# Altium footprint library 7-Connectors-13.PcbLib: 44 footprints (part 4 of 5)
Each footprint in its own frame and in the unit in brackets; x right, y up, seen from the top. Pads: shape width x height; smd on the part's side, far side on the other; paste and mask are expansions set on the pad; w line width, h text height; cw(c..) or ccw(c..) is an arc to the next point about the centre after c.
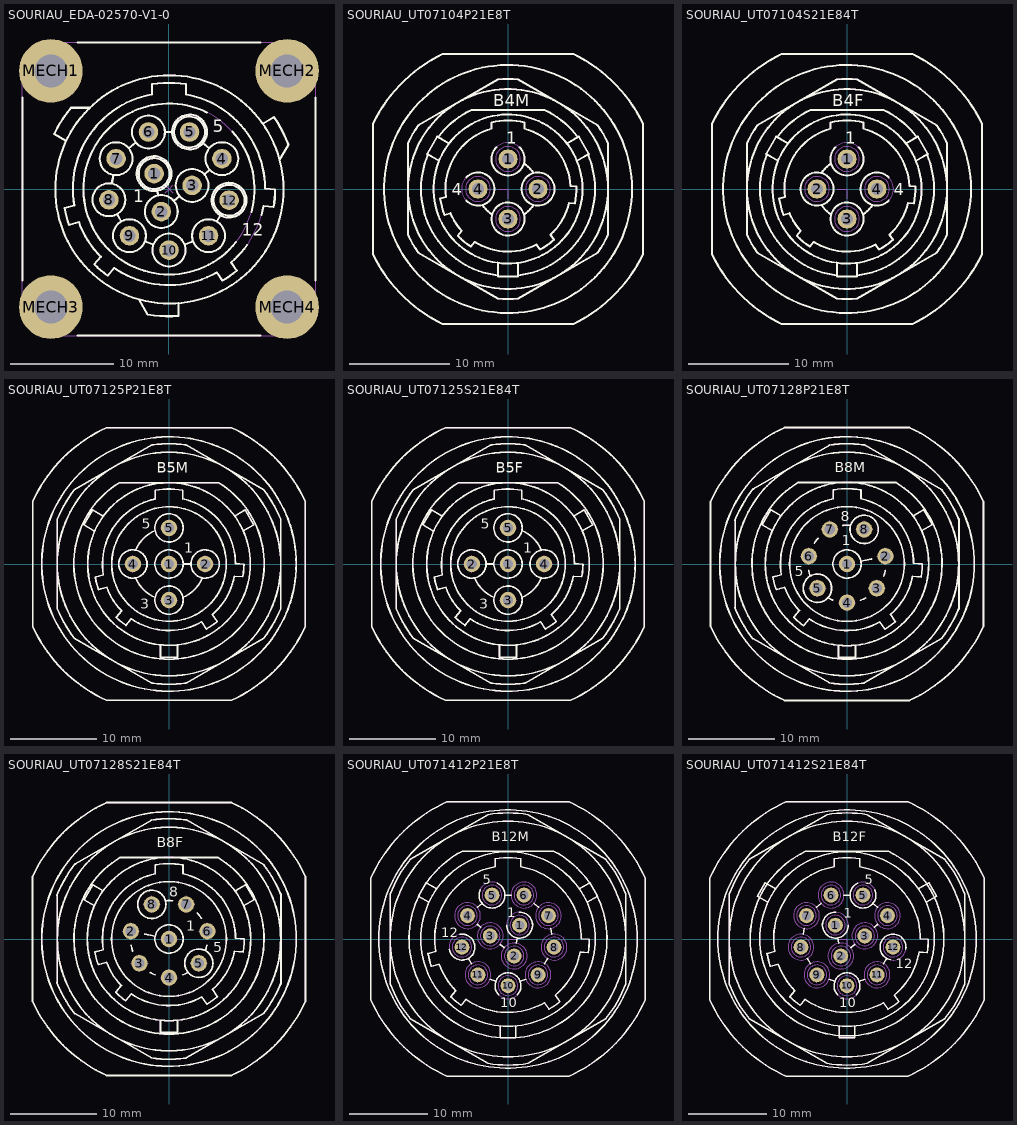
[diagram p3: the footprints below, top view; thin cyan lines are the x and y axes]

## SOURIAU_EDA-02570-V1-0 [mm] "Adapter Kit For PCB Mount For SOURIAU UTO01412S21T, 12 Poles, Shell Size 14, UT Bantam Circular Female Connecteur"
height 32.93
pads (16):
  round 1.9 hole 1.2: 1(-1.45,1.5) 2(-0.75,-2.2) 3(2.25,0.35) 4(5.15,2.95) 5(2,5.55) 6(-2,5.55) 7(-5.15,2.95) 8(-5.85,-1.05) 9(-3.85,-4.55) 10(0,-5.95) 11(3.85,-4.55) 12(5.85,-1.09)
  round 6.2 hole 3.2: MECH1(-11.505,11.505) MECH2(11.505,11.505) MECH3(-11.505,-11.505) MECH4(11.505,-11.505)
Top Overlay:
  circle w0.2: c0.043,-0.043 r11.113
  circle w0.2: c5.85,-1.09 r1.5
  circle w0.2: c2,5.55 r1.5
  circle w0.2: c-1.45,1.5 r1.5
  circle w0.2: c-5.85,-1.05 r1.6
  circle w0.2: c-3.85,-4.55 r1.6
  circle w0.2: c-0.75,-2.2 r1.6
  circle w0.2: c0,-5.95 r1.6
  circle w0.2: c3.85,-4.55 r1.6
  circle w0.2: c5.85,-1.09 r1.7
  circle w0.2: c2.25,0.35 r1.6
  circle w0.2: c-1.45,1.5 r1.7
  circle w0.2: c-5.15,2.95 r1.6
  circle w0.2: c5.15,2.95 r1.6
  circle w0.2: c2,5.55 r1.7
  circle w0.2: c-2,5.55 r1.6
  lines w0.2: -14.285,-8.914 -14.285,8.914 ; -10.012,4.689 -11.176,5.361 cw(c0,0) -9.541,7.913 -7.717,7.913 ; -8.914,-14.285 8.914,-14.285 ; -8.914,14.285 8.914,14.285 ; -5.574,0.526 -5.426,1.374 ; -5.056,-2.439 -4.644,-3.161 ; -3.916,3.969 -3.234,4.531 ; -2.93,-10.75 -2.082,-12.219 ccw(c0,0) 0.945,-12.359 0.945,-11.119 ; -2.346,-5.097 -1.504,-5.403 ; -1.153,-0.072 -1.047,-0.628 ; -0.4,5.55 0.4,5.55 ; 0.469,-1.164 1.031,-0.686 ; 1.504,-5.403 2.346,-5.097 ; 3.234,4.531 3.916,3.969 ; 3.441,1.418 3.959,1.882 ; 3.681,7.467 ccw(c0,0) 6.533,-5.16 ; 4.651,-3.165 5.049,-2.475 ; 6.161,5.599 cw(c0,0) 8.013,-2.258 ; 7.608,-5.452 cw(c0,0) 6.043,-7.148 6.604,-7.95 cw(c0,0) 5.212,-8.925 4.65,-8.123 cw(c0,0) -5.34,-7.687 -5.97,-8.437 cw(c0,0) -7.272,-7.344 -6.643,-6.594 cw(c0,0) -8.784,-3.234 -9.729,-3.487 cw(c0,0) -10.169,-1.845 -9.224,-1.592 cw(c0,0) -1.65,9.213 -1.65,10.202 cw(c0,0) 1.65,10.202 1.65,9.213 cw(c0,0) 9.36,0.034 10.335,-0.051 cw(c0,0) 10.187,-1.744 9.212,-1.659 cw(c0,0) 9.006,-2.551 ; 9.126,6.36 10.231,6.998 cw(c0,0) 11.623,4.306 10.775,2.838 ; 14.285,-8.914 14.285,8.914
  text "1" at -3.475,-1.3 h1.2
  text "5" at 4.275,5.525 h1.2
  text "12" at 7.075,-4.55 h1.2
Mechanical 8:
  lines w0.1: -12.005,-11.505 -11.505,-11.505 ; -12.005,11.505 -11.505,11.505 ; -11.505,-12.005 -11.505,-11.505 ; -11.505,-11.005 -11.505,-11.505 ; -11.505,11.005 -11.505,11.505 ; -11.505,12.005 -11.505,11.505 ; -11.005,-11.505 -11.505,-11.505 ; -11.005,11.505 -11.505,11.505 ; -6.35,-1.05 -5.85,-1.05 ; -5.85,-1.55 -5.85,-1.05 ; -5.85,-0.55 -5.85,-1.05 ; -5.65,2.95 -5.15,2.95 ; -5.35,-1.05 -5.85,-1.05 ; -5.15,2.45 -5.15,2.95 ; -5.15,3.45 -5.15,2.95 ; -4.65,2.95 -5.15,2.95 ; -4.35,-4.55 -3.85,-4.55 ; -3.85,-5.05 -3.85,-4.55 ; -3.85,-4.05 -3.85,-4.55 ; -3.35,-4.55 -3.85,-4.55 ; -2.5,5.55 -2,5.55 ; -2,5.05 -2,5.55 ; -2,6.05 -2,5.55 ; -1.95,1.5 -1.45,1.5 ; -1.5,5.55 -2,5.55 ; -1.45,1 -1.45,1.5 ; -1.45,2 -1.45,1.5 ; -1.25,-2.2 -0.75,-2.2 ; -0.95,1.5 -1.45,1.5 ; -0.75,-2.7 -0.75,-2.2 ; -0.75,-1.7 -0.75,-2.2 ; -0.5,-5.95 0,-5.95 ; -0.354,-0.354 0,0 ; -0.354,0.354 0,0 ; -0.25,-2.2 -0.75,-2.2 ; 0,-6.45 0,-5.95 ; 0,-5.45 0,-5.95 ; 0.354,-0.354 0,0 ; 0.354,0.354 0,0 ; 0.5,-5.95 0,-5.95 ; 1.5,5.55 2,5.55 ; 1.75,0.35 2.25,0.35 ; 2,5.05 2,5.55 ; 2,6.05 2,5.55 ; 2.25,-0.15 2.25,0.35 ; 2.25,0.85 2.25,0.35 ; 2.5,5.55 2,5.55 ; 2.75,0.35 2.25,0.35 ; 3.35,-4.55 3.85,-4.55 ; 3.85,-5.05 3.85,-4.55 ; 3.85,-4.05 3.85,-4.55 ; 4.35,-4.55 3.85,-4.55 ; 4.65,2.95 5.15,2.95 ; 5.15,2.45 5.15,2.95 ; 5.15,3.45 5.15,2.95 ; 5.35,-1.09 5.85,-1.09 ; 5.65,2.95 5.15,2.95 ; 5.85,-1.59 5.85,-1.09 ; 5.85,-0.59 5.85,-1.09 ; 6.35,-1.09 5.85,-1.09 ; 11.005,-11.505 11.505,-11.505 ; 11.005,11.505 11.505,11.505 ; 11.505,-12.005 11.505,-11.505 ; 11.505,-11.005 11.505,-11.505 ; 11.505,11.005 11.505,11.505 ; 11.505,12.005 11.505,11.505 ; 12.005,-11.505 11.505,-11.505 ; 12.005,11.505 11.505,11.505
Mechanical 14:
  circle w0.1: c11.505,-11.505 r1.45
  circle w0.1: c11.505,-11.505 r2.8
  circle w0.1: c-11.505,-11.505 r1.45
  circle w0.1: c-11.505,-11.505 r2.8
  circle w0.1: c-11.505,11.505 r1.45
  circle w0.1: c-11.505,11.505 r2.8
  circle w0.1: c11.505,11.505 r1.45
  circle w0.1: c11.505,11.505 r2.8
  circle w0.1: c-5.85,-1.05 r1.6
  circle w0.1: c-3.85,-4.55 r1.6
  circle w0.1: c-0.75,-2.2 r1.6
  circle w0.1: c0,-5.95 r1.6
  circle w0.1: c3.85,-4.55 r1.6
  circle w0.1: c5.85,-1.09 r1.6
  circle w0.1: c2.25,0.35 r1.6
  circle w0.1: c-1.45,1.5 r1.6
  circle w0.1: c-5.15,2.95 r1.6
  circle w0.1: c5.15,2.95 r1.6
  circle w0.1: c2,5.55 r1.6
  circle w0.1: c-2,5.55 r1.6
  circle w0.1: c0,0 r8.325
  circle w0.1: c0.043,-0.043 r11.113
  lines w0.1: -10.012,4.689 -11.176,5.361 cw(c0,0) -9.541,7.913 -7.717,7.913 ; -5.574,0.526 -5.426,1.374 ; -5.056,-2.439 -4.644,-3.161 ; -3.916,3.969 -3.234,4.531 ; -2.93,-10.75 -2.082,-12.219 ccw(c0,0) 0.945,-12.359 0.945,-11.119 ; -2.346,-5.097 -1.504,-5.403 ; -1.153,-0.072 -1.047,-0.628 ; -0.4,5.55 0.4,5.55 ; 0.469,-1.164 1.031,-0.686 ; 1.504,-5.403 2.346,-5.097 ; 3.234,4.531 3.916,3.969 ; 3.441,1.418 3.959,1.882 ; 4.651,-3.165 5.049,-2.475 ; 9.126,6.36 10.231,6.998 cw(c0,0) 11.623,4.306 10.775,2.838 ; -14.285,-12.603 -14.285,12.603 -12.603,14.285 12.603,14.285 14.285,12.603 14.285,-12.603 12.603,-14.285 -12.603,-14.285 -14.285,-12.603 ; -12.667,-11.861 ccw(c-12.475,-12.065) -12.395,-12.333 cw(c-12.254,-12.803) -11.777,-12.69 ccw(c-11.505,-12.625) -11.233,-12.69 cw(c-10.756,-12.803) -10.615,-12.333 ccw(c-10.535,-12.065) -10.343,-11.861 cw(c-10.007,-11.505) -10.343,-11.149 ccw(c-10.535,-10.945) -10.615,-10.677 cw(c-10.756,-10.207) -11.233,-10.32 ccw(c-11.505,-10.385) -11.777,-10.32 cw(c-12.254,-10.207) -12.395,-10.677 ccw(c-12.475,-10.945) -12.667,-11.149 cw(c-13.003,-11.505) -12.667,-11.861 ; -12.667,11.149 ccw(c-12.475,10.945) -12.395,10.677 cw(c-12.254,10.207) -11.777,10.32 ccw(c-11.505,10.385) -11.233,10.32 cw(c-10.756,10.207) -10.615,10.677 ccw(c-10.535,10.945) -10.343,11.149 cw(c-10.007,11.505) -10.343,11.861 ccw(c-10.535,12.065) -10.615,12.333 cw(c-10.756,12.803) -11.233,12.69 ccw(c-11.505,12.625) -11.777,12.69 cw(c-12.254,12.803) -12.395,12.333 ccw(c-12.475,12.065) -12.667,11.861 cw(c-13.003,11.505) -12.667,11.149 ; -10.169,-1.845 ccw(c0,0) -9.729,-3.487 -8.784,-3.234 ccw(c0,0) -6.643,-6.594 -7.272,-7.344 ccw(c0,0) -5.97,-8.437 -5.34,-7.687 ccw(c0,0) 4.65,-8.123 5.212,-8.925 ccw(c0,0) 6.604,-7.95 6.043,-7.148 ccw(c0,0) 9.212,-1.659 10.187,-1.744 ccw(c0,0) 10.335,-0.051 9.36,0.034 ccw(c0,0) 1.65,9.213 1.65,10.202 ccw(c0,0) -1.65,10.202 -1.65,9.213 ccw(c0,0) -9.224,-1.592 -10.169,-1.845 ; 10.343,-11.861 ccw(c10.535,-12.065) 10.615,-12.333 cw(c10.756,-12.803) 11.233,-12.69 ccw(c11.505,-12.625) 11.777,-12.69 cw(c12.254,-12.803) 12.395,-12.333 ccw(c12.475,-12.065) 12.667,-11.861 cw(c13.003,-11.505) 12.667,-11.149 ccw(c12.475,-10.945) 12.395,-10.677 cw(c12.254,-10.207) 11.777,-10.32 ccw(c11.505,-10.385) 11.233,-10.32 cw(c10.756,-10.207) 10.615,-10.677 ccw(c10.535,-10.945) 10.343,-11.149 cw(c10.007,-11.505) 10.343,-11.861 ; 10.343,11.149 ccw(c10.535,10.945) 10.615,10.677 cw(c10.756,10.207) 11.233,10.32 ccw(c11.505,10.385) 11.777,10.32 cw(c12.254,10.207) 12.395,10.677 ccw(c12.475,10.945) 12.667,11.149 cw(c13.003,11.505) 12.667,11.861 ccw(c12.475,12.065) 12.395,12.333 cw(c12.254,12.803) 11.777,12.69 ccw(c11.505,12.625) 11.233,12.69 cw(c10.756,12.803) 10.615,12.333 ccw(c10.535,12.065) 10.343,11.861 cw(c10.007,11.505) 10.343,11.149
  text "1" at -1.593,0.9 h1.2
  text "5" at 1.6,4.95 h1.2
  text "12" at 4.993,-1.69 h1.2
3D body "EDA-02570-V1-0.stp": height 32.93, standoff -5.89, extent -14.605,-14.604 14.605,14.599

## SOURIAU_UT07104P21E8T [mm] "Metal Circular Connector, 4 Male Contacts, Shell Size 10, UT07 Series"
height 31.7
pads (4):
  round 1.9 hole 1.2: 1(0,3) 2(3,0) 3(0,-3) 4(-3,0)
Top Overlay:
  circle w0.2: c3,0 r1.65
  circle w0.2: c0,-3 r1.65
  circle w0.2: c0,0 r12.4
  circle w0.2: c0,0 r10
  circle w0.2: c0,0 r7.45
  lines w0.2: -7.984,3.455 ccw(c0,0) -1,-8.642 ; -6.984,5.187 cw(c0,0) -3.644,7.9 3.644,7.9 cw(c0,0) 6.984,5.187 ; -6.894,2.825 -8.078,3.509 -7.078,5.241 -5.894,4.557 ; -4.175,-1.159 ccw(c-3,0) -4.175,1.159 ; -2.546,-1.586 ccw(c0,0) -1.586,-2.546 ; -1.159,4.175 ccw(c0,3) 1.159,4.175 ; -1,-7.383 -1,-8.75 1,-8.75 1,-7.383 ; 1,-8.642 ccw(c0,0) 7.984,3.455 ; 1.586,-2.546 ccw(c0,0) 2.546,-1.586 ; 1.586,2.546 cw(c0,0) 2.546,1.586 ; 5.894,4.557 7.078,5.241 8.078,3.509 6.894,2.825 ; -13.5,-6.538 ccw(c0,0) -6.538,-13.5 6.538,-13.5 ccw(c0,0) 13.5,-6.538 13.5,6.538 ccw(c0,0) 6.538,13.5 -6.538,13.5 ccw(c0,0) -13.5,6.538 -13.5,-6.538 ; -10,-4.583 ccw(c0,0) -8.969,-6.369 -1.031,-10.952 ccw(c0,0) 1.031,-10.952 8.969,-6.369 ccw(c0,0) 10,-4.583 10,4.583 ccw(c0,0) 8.969,6.369 1.031,10.952 ccw(c0,0) -1.031,10.952 -8.969,6.369 ccw(c0,0) -10,4.583 -10,-4.583 ; -6.785,-0.938 ccw(c0,0) -6.345,-2.58 -5.761,-2.424 ccw(c0,0) -4.631,-4.197 -5.02,-4.66 ccw(c0,0) -3.718,-5.753 -3.329,-5.29 ccw(c0,0) 2.855,-5.56 3.202,-6.055 ccw(c0,0) 4.595,-5.08 4.248,-4.585 ccw(c0,0) 6.094,-1.386 6.697,-1.439 ccw(c0,0) 6.845,0.254 6.242,0.307 ccw(c0,0) 1.65,6.028 1.65,6.648 ccw(c0,0) -1.65,6.648 -1.65,6.028 ccw(c0,0) -6.201,-0.782 -6.785,-0.938
  text "B4M" at -1.456,8.253 h1.2
  text "1" at -0.186,4.522 h1.2
  text "4" at -5.636,-0.625 h1.2
Mechanical 8:
  circle w0.1: c-3,0 r1.65
  circle w0.1: c-3,0 r1.25
  circle w0.1: c0,-3 r1.65
  circle w0.1: c0,-3 r1.25
  circle w0.1: c3,0 r1.65
  circle w0.1: c3,0 r1.25
  circle w0.1: c0,3 r1.65
  circle w0.1: c0,3 r1.25
  lines w0.1: -3,-1 -3,0 -2,0 ; -1,0 0,0 0,-1 ; 0,-4 0,-3 1,-3 ; 0,2 0,3 1,3 ; 3,-1 3,0 4,0
Mechanical 14:
  circle w0.1: c3,0 r1.65
  circle w0.1: c0,-3 r1.65
  circle w0.1: c0,0 r12.4
  circle w0.1: c0,0 r10
  circle w0.1: c0,0 r7.45
  lines w0.1: -7.984,3.455 ccw(c0,0) -1,-8.642 ; -6.984,5.187 cw(c0,0) -3.644,7.9 3.644,7.9 cw(c0,0) 6.984,5.187 ; -6.894,2.825 -8.078,3.509 -7.078,5.241 -5.894,4.557 ; -4.175,-1.159 ccw(c-3,0) -4.175,1.159 ; -2.546,-1.586 ccw(c0,0) -1.586,-2.546 ; -1.159,4.175 ccw(c0,3) 1.159,4.175 ; -1,-7.383 -1,-8.75 1,-8.75 1,-7.383 ; 1,-8.642 ccw(c0,0) 7.984,3.455 ; 1.586,-2.546 ccw(c0,0) 2.546,-1.586 ; 1.586,2.546 cw(c0,0) 2.546,1.586 ; 5.894,4.557 7.078,5.241 8.078,3.509 6.894,2.825 ; -13.5,-6.538 ccw(c0,0) -6.538,-13.5 6.538,-13.5 ccw(c0,0) 13.5,-6.538 13.5,6.538 ccw(c0,0) 6.538,13.5 -6.538,13.5 ccw(c0,0) -13.5,6.538 -13.5,-6.538 ; -10,-4.583 ccw(c0,0) -8.969,-6.369 -1.031,-10.952 ccw(c0,0) 1.031,-10.952 8.969,-6.369 ccw(c0,0) 10,-4.583 10,4.583 ccw(c0,0) 8.969,6.369 1.031,10.952 ccw(c0,0) -1.031,10.952 -8.969,6.369 ccw(c0,0) -10,4.583 -10,-4.583 ; -6.785,-0.938 ccw(c0,0) -6.345,-2.58 -5.761,-2.424 ccw(c0,0) -4.631,-4.197 -5.02,-4.66 ccw(c0,0) -3.718,-5.753 -3.329,-5.29 ccw(c0,0) 2.855,-5.56 3.202,-6.055 ccw(c0,0) 4.595,-5.08 4.248,-4.585 ccw(c0,0) 6.094,-1.386 6.697,-1.439 ccw(c0,0) 6.845,0.254 6.242,0.307 ccw(c0,0) 1.65,6.028 1.65,6.648 ccw(c0,0) -1.65,6.648 -1.65,6.028 ccw(c0,0) -6.201,-0.782 -6.785,-0.938
  text "B4M" at -1.456,8.253 h1.2
  text "1" at -0.186,4.522 h1.2
  text "4" at -5.636,-0.625 h1.2
3D body "SOURIAU_UT07104P21E8T.stp": height 31.35, standoff -4.75, extent -13.485,-13.485 13.485,13.485

## SOURIAU_UT07104S21E84T [mm] "Metal Circular Connector, 4 Female Contacts, Shell Size 10, UT07 Series"
height 24.3
pads (4):
  round 1.9 hole 1.2: 1(0,3) 2(-3,0) 3(0,-3) 4(3,0)
Top Overlay:
  circle w0.2: c-3,0 r1.65
  circle w0.2: c0,-3 r1.65
  circle w0.2: c0,0 r12.4
  circle w0.2: c0,0 r10
  circle w0.2: c0,0 r7.45
  lines w0.2: -7.984,3.455 ccw(c0,0) -1,-8.642 ; -6.984,5.187 cw(c0,0) -3.644,7.9 3.644,7.9 cw(c0,0) 6.984,5.187 ; -6.894,2.825 -8.078,3.509 -7.078,5.241 -5.894,4.557 ; -2.546,1.586 cw(c0,0) -1.586,2.546 ; -2.541,-1.595 ccw(c0,0) -1.586,-2.546 ; -1.159,4.175 ccw(c0,3) 1.159,4.175 ; -1,-7.383 -1,-8.75 1,-8.75 1,-7.383 ; 1,-8.642 ccw(c0,0) 7.984,3.455 ; 1.586,-2.546 ccw(c0,0) 2.546,-1.586 ; 4.175,-1.159 cw(c3,0) 4.175,1.159 ; 5.894,4.557 7.078,5.241 8.078,3.509 6.894,2.825 ; -13.5,-6.538 ccw(c0,0) -6.538,-13.5 6.538,-13.5 ccw(c0,0) 13.5,-6.538 13.5,6.538 ccw(c0,0) 6.538,13.5 -6.538,13.5 ccw(c0,0) -13.5,6.538 -13.5,-6.538 ; -10,-4.583 ccw(c0,0) -8.969,-6.369 -1.031,-10.952 ccw(c0,0) 1.031,-10.952 8.969,-6.369 ccw(c0,0) 10,-4.583 10,4.583 ccw(c0,0) 8.969,6.369 1.031,10.952 ccw(c0,0) -1.031,10.952 -8.969,6.369 ccw(c0,0) -10,4.583 -10,-4.583 ; -6.785,-0.938 ccw(c0,0) -6.345,-2.58 -5.761,-2.424 ccw(c0,0) -4.631,-4.197 -5.02,-4.66 ccw(c0,0) -3.718,-5.753 -3.329,-5.29 ccw(c0,0) 2.855,-5.56 3.202,-6.055 ccw(c0,0) 4.595,-5.08 4.248,-4.585 ccw(c0,0) 6.094,-1.386 6.697,-1.439 ccw(c0,0) 6.845,0.254 6.242,0.307 ccw(c0,0) 1.65,6.028 1.65,6.648 ccw(c0,0) -1.65,6.648 -1.65,6.028 ccw(c0,0) -6.201,-0.782 -6.785,-0.938
  text "1" at -0.186,4.522 h1.2
  text "4" at 4.664,-0.625 h1.2
  text "B4F" at -1.456,8.253 h1.2
Mechanical 8:
  circle w0.1: c3,0 r1.65
  circle w0.1: c3,0 r1.25
  circle w0.1: c0,-3 r1.65
  circle w0.1: c0,-3 r1.25
  circle w0.1: c-3,0 r1.65
  circle w0.1: c-3,0 r1.25
  circle w0.1: c0,3 r1.65
  circle w0.1: c0,3 r1.25
  lines w0.1: -4,0 -3,0 -3,-1 ; -1,0 0,0 0,-1 ; 0,-4 0,-3 1,-3 ; 0,2 0,3 1,3 ; 2,0 3,0 3,-1
Mechanical 14:
  circle w0.1: c-3,0 r1.65
  circle w0.1: c0,-3 r1.65
  circle w0.1: c0,0 r12.4
  circle w0.1: c0,0 r10
  circle w0.1: c0,0 r7.45
  lines w0.1: -7.984,3.455 ccw(c0,0) -1,-8.642 ; -6.984,5.187 cw(c0,0) -3.644,7.9 3.644,7.9 cw(c0,0) 6.984,5.187 ; -6.894,2.825 -8.078,3.509 -7.078,5.241 -5.894,4.557 ; -2.546,1.586 cw(c0,0) -1.586,2.546 ; -2.541,-1.595 ccw(c0,0) -1.586,-2.546 ; -1.159,4.175 ccw(c0,3) 1.159,4.175 ; -1,-7.383 -1,-8.75 1,-8.75 1,-7.383 ; 1,-8.642 ccw(c0,0) 7.984,3.455 ; 1.586,-2.546 ccw(c0,0) 2.546,-1.586 ; 4.175,-1.159 cw(c3,0) 4.175,1.159 ; 5.894,4.557 7.078,5.241 8.078,3.509 6.894,2.825 ; -13.5,-6.538 ccw(c0,0) -6.538,-13.5 6.538,-13.5 ccw(c0,0) 13.5,-6.538 13.5,6.538 ccw(c0,0) 6.538,13.5 -6.538,13.5 ccw(c0,0) -13.5,6.538 -13.5,-6.538 ; -10,-4.583 ccw(c0,0) -8.969,-6.369 -1.031,-10.952 ccw(c0,0) 1.031,-10.952 8.969,-6.369 ccw(c0,0) 10,-4.583 10,4.583 ccw(c0,0) 8.969,6.369 1.031,10.952 ccw(c0,0) -1.031,10.952 -8.969,6.369 ccw(c0,0) -10,4.583 -10,-4.583 ; -6.785,-0.938 ccw(c0,0) -6.345,-2.58 -5.761,-2.424 ccw(c0,0) -4.631,-4.197 -5.02,-4.66 ccw(c0,0) -3.718,-5.753 -3.329,-5.29 ccw(c0,0) 2.855,-5.56 3.202,-6.055 ccw(c0,0) 4.595,-5.08 4.248,-4.585 ccw(c0,0) 6.094,-1.386 6.697,-1.439 ccw(c0,0) 6.845,0.254 6.242,0.307 ccw(c0,0) 1.65,6.028 1.65,6.648 ccw(c0,0) -1.65,6.648 -1.65,6.028 ccw(c0,0) -6.201,-0.782 -6.785,-0.938
  text "1" at -0.186,4.522 h1.2
  text "4" at 4.664,-0.625 h1.2
  text "B4F" at -1.456,8.253 h1.2
3D body "SOURIAU_UT07104S21E84T.stp": height 23.75, standoff -4.75, extent -13.485,-13.485 13.485,13.485

## SOURIAU_UT07125P21E8T [mm] "Metal Circular Connector, 5 Male Contacts, Shell Size 12, UT07 Series"
height 31.7
pads (5):
  round 1.9 hole 1.2: 1(0,0) 2(4.211,0) 3(0,-4.211) 4(-4.211,0) 5(0,4.211)
Top Overlay:
  circle w0.2: c0,0 r14.835
  circle w0.2: c0,0 r13.029
  circle w0.2: c0,0 r9.479
  circle w0.2: c0,0 r6.677
  circle w0.2: c0,0 r1.65
  circle w0.2: c4.211,0 r1.65
  circle w0.2: c0,-4.211 r1.65
  circle w0.2: c-4.211,0 r1.65
  circle w0.2: c0,4.211 r1.65
  lines w0.2: -4.39,-6.393 ccw(c0,0) 3.807,-6.756 4.372,-7.574 ccw(c0,0) 5.598,-6.719 5.035,-5.889 ; -4.387,-6.389 -5.017,-7.163 cw(c0,0) -6.17,-6.197 -5.528,-5.438 cw(c0,0) -7.267,-2.707 -8.226,-2.969 cw(c0,0) -8.611,-1.527 -7.651,-1.265 cw(c0,0) -1.619,7.584 ; -3.887,-1.618 ccw(c0,0) -1.618,-3.887 ; -3.887,1.618 cw(c0,0) -1.618,3.887 ; -1.619,7.567 -1.619,8.594 cw(c0,0) 1.59,8.599 1.59,7.567 ; -1.001,-9.426 -1.001,-10.865 1.001,-10.865 1.001,-9.426 ; 1.59,7.59 cw(c0,0) 7.755,0.058 ; 1.618,-3.887 ccw(c0,0) 3.887,-1.618 ; 1.65,0 2.561,0 ; 5.039,-5.895 ccw(c0,0) 7.625,-1.416 ; 7.597,-1.413 8.615,-1.501 ccw(c0,0) 8.745,-0.029 7.744,0.059 ; 7.655,5.59 8.894,6.302 9.893,4.564 8.66,3.855 ; -9.921,4.563 -8.666,3.841 -9.921,4.563 ; -9.921,4.563 -8.922,6.301 ; -8.922,6.301 -7.664,5.578 -8.922,6.301 ; -15.9,-7.284 ccw(c0,0) -7.284,-15.9 7.284,-15.9 ccw(c0,0) 15.9,-7.284 15.9,7.284 ccw(c0,0) 7.284,15.9 -7.284,15.9 ccw(c0,0) -15.9,7.284 -15.9,-7.284 ; -13.014,-5.222 ccw(c0,0) -11.049,-8.635 -1.977,-13.883 ccw(c0,0) 1.977,-13.883 11.049,-8.635 ccw(c0,0) 13.014,-5.222 13.014,5.222 ccw(c0,0) 11.049,8.635 1.977,13.883 ccw(c0,0) -1.977,13.883 -11.049,8.635 ccw(c0,0) -13.014,5.222 -13.014,-5.222 ; -5.774,9.481 ccw(c0,0) 5.774,9.481 -5.774,9.481
  text "3" at -3.336,-5.226 h1.2
  text "5" at -3.167,4.099 h1.2
  text "1" at 1.789,1.324 h1.2
  text "B5M" at -1.456,10.666 h1.25
Mechanical 8:
  lines w0.1: -5.211,0 -4.211,0 ; -4.211,-1 -4.211,0 ; -4.211,1 -4.211,0 ; -3.211,0 -4.211,0 ; -1,-4.211 0,-4.211 ; -1,0 0,0 ; -1,4.211 0,4.211 ; 0,-5.211 0,-4.211 ; 0,-3.211 0,-4.211 ; 0,-1 0,0 ; 0,1 0,0 ; 0,3.211 0,4.211 ; 0,5.211 0,4.211 ; 1,-4.211 0,-4.211 ; 1,0 0,0 ; 1,4.211 0,4.211 ; 3.211,0 4.211,0 ; 4.211,-1 4.211,0 ; 4.211,1 4.211,0 ; 5.211,0 4.211,0
Mechanical 14:
  circle w0.1: c0,0 r14.835
  circle w0.1: c0,0 r13.029
  circle w0.1: c0,0 r9.479
  circle w0.1: c0,0 r6.677
  circle w0.1: c0,0 r1.65
  circle w0.1: c4.211,0 r1.65
  circle w0.1: c0,-4.211 r1.65
  circle w0.1: c-4.211,0 r1.65
  circle w0.1: c0,4.211 r1.65
  lines w0.1: -4.39,-6.393 ccw(c0,0) 3.807,-6.756 4.372,-7.574 ccw(c0,0) 5.598,-6.719 5.035,-5.889 ; -4.387,-6.389 -5.017,-7.163 cw(c0,0) -6.17,-6.197 -5.528,-5.438 cw(c0,0) -7.267,-2.707 -8.226,-2.969 cw(c0,0) -8.611,-1.527 -7.651,-1.265 cw(c0,0) -1.619,7.584 ; -3.887,-1.618 ccw(c0,0) -1.618,-3.887 ; -3.887,1.618 cw(c0,0) -1.618,3.887 ; -1.619,7.567 -1.619,8.594 cw(c0,0) 1.59,8.599 1.59,7.567 ; -1.001,-9.426 -1.001,-10.865 1.001,-10.865 1.001,-9.426 ; 1.59,7.59 cw(c0,0) 7.755,0.058 ; 1.618,-3.887 ccw(c0,0) 3.887,-1.618 ; 1.65,0 2.561,0 ; 5.039,-5.895 ccw(c0,0) 7.625,-1.416 ; 7.597,-1.413 8.615,-1.501 ccw(c0,0) 8.745,-0.029 7.744,0.059 ; 7.655,5.59 8.894,6.302 9.893,4.564 8.66,3.855 ; -9.921,4.563 -8.666,3.841 -9.921,4.563 ; -9.921,4.563 -8.922,6.301 ; -8.922,6.301 -7.664,5.578 -8.922,6.301 ; -15.9,-7.284 ccw(c0,0) -7.284,-15.9 7.284,-15.9 ccw(c0,0) 15.9,-7.284 15.9,7.284 ccw(c0,0) 7.284,15.9 -7.284,15.9 ccw(c0,0) -15.9,7.284 -15.9,-7.284 ; -13.014,-5.222 ccw(c0,0) -11.049,-8.635 -1.977,-13.883 ccw(c0,0) 1.977,-13.883 11.049,-8.635 ccw(c0,0) 13.014,-5.222 13.014,5.222 ccw(c0,0) 11.049,8.635 1.977,13.883 ccw(c0,0) -1.977,13.883 -11.049,8.635 ccw(c0,0) -13.014,5.222 -13.014,-5.222 ; -5.774,9.481 ccw(c0,0) 5.774,9.481 -5.774,9.481
  text "3" at -3.336,-5.226 h1.2
  text "5" at -3.167,4.099 h1.2
  text "1" at 1.789,1.324 h1.2
  text "B5M" at -1.456,10.666 h1.25
3D body "SOURIAU_UT07125P21E8T.stp": height 31.35, standoff -4.75, extent -15.875,-15.875 15.875,15.875
